# Altium footprint library Components.PcbLib: 139 footprints (part 2 of 9)
Each footprint in its own frame and in the unit in brackets; x right, y up, seen from the top. Pads: shape width x height; smd on the part's side, far side on the other; paste and mask are expansions set on the pad; w line width, h text height; cw(c..) or ccw(c..) is an arc to the next point about the centre after c.
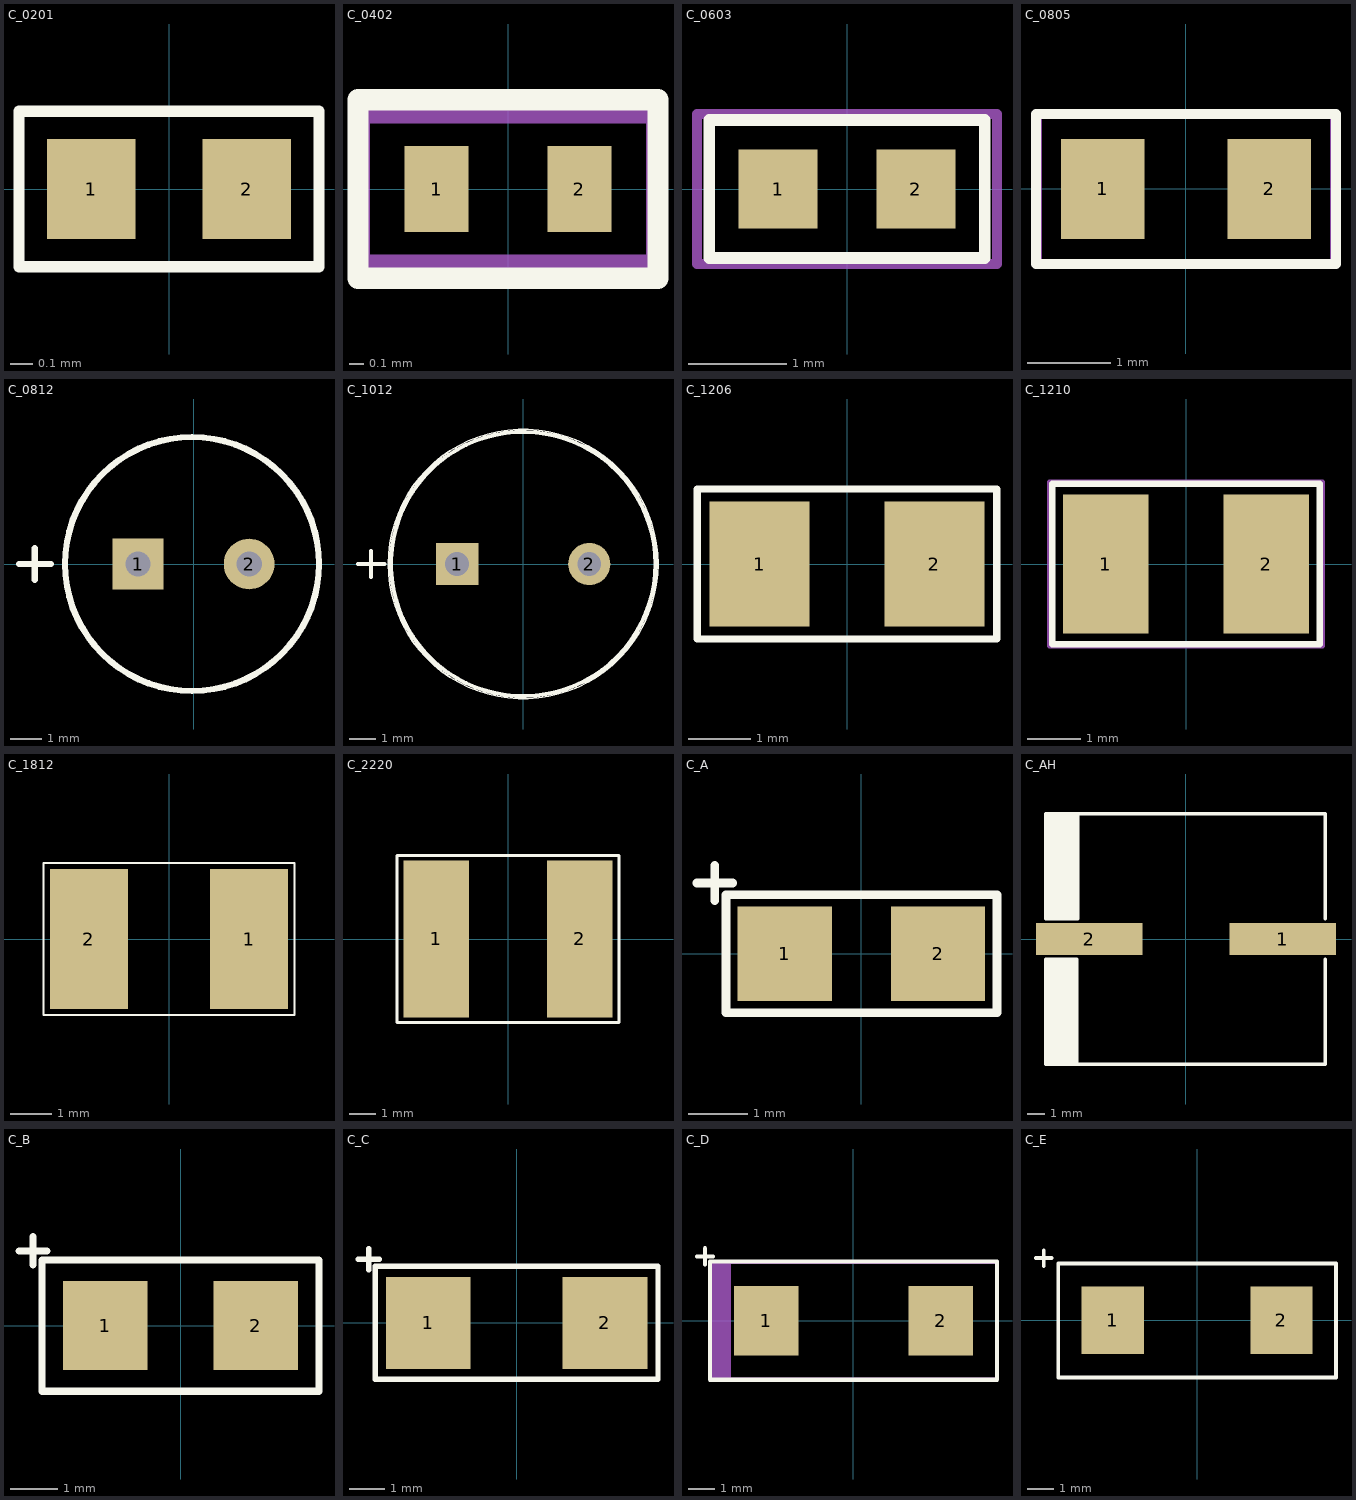
[diagram p1: the footprints below, top view; thin cyan lines are the x and y axes]

## C_0201 [mm]
pads (2):
  rect 0.4x0.45 smd paste-0.03 mask+0.04: 1(-0.35,0) 2(0.35,0)
Top Overlay:
  lines w0.05: -0.675,-0.35 -0.675,0.35 0.675,0.35 0.675,-0.35 -0.675,-0.35
3D body "User Library-SMD CAPACITOR.step": height 0.29, standoff -0.01, extent -0.3,-0.15 0.3,0.15

## C_0402 [mm]
pads (2):
  rect 0.45x0.6 smd paste-0.04 mask+0.05: 1(-0.5,0) 2(0.5,0)
Top Overlay:
  lines w0.15: -1.05,-0.625 -1.05,0.125 -1.05,0.625 1.05,0.625 1.05,-0.625 -1.05,-0.625
Mechanical 29:
  lines w0.1: -1.016,-0.508 1.016,-0.508 1.016,0.508 -1.016,0.508 -1.016,-0.508
  text ".Designator" at -0.889,-0.254 h0.5
3D body "SW3dPS-0402 SMD Capacitor.STEP": height 0.2, standoff 0, extent -0.5,-0.3 0.5,0.3

## C_0603 [mm]
pads (2):
  rect 0.8x0.8 smd paste-0.06 mask+0.08: 1(-0.7,0) 2(0.7,0)
Top Overlay:
  lines w0.12: -1.4,-0.7 -1.4,0 -1.4,0.7 1.4,0.7 1.4,-0.7 -1.4,-0.7
Mechanical 29:
  lines w0.1: -1.524,-0.762 -1.524,0.762 1.524,0.762 1.524,-0.762 -1.524,-0.762
  text ".Designator" at -1.27,-0.254 h0.8
3D body "SW3dPS-0603 SMD Capacitor.STEP": height 0.3, standoff 0, extent -0.8,-0.4 0.8,0.4

## C_0805 [mm]
pads (2):
  rect 1x1.2 smd paste-0.05 mask+0.102: 1(-1,0) 2(1,0)
Top Overlay:
  lines w0.12: -1.8,-0.9 -1.8,0 -1.8,0.9 1.8,0.9 1.8,-0.9 -1.8,-0.9
Mechanical 29:
  lines w0.1: -1.778,-0.889 -1.778,0.889 1.778,0.889 1.778,-0.889 -1.778,-0.889
  text ".Designator" at -1.651,-0.381 h0.8
3D body "SW3dPS-0805 SMD Capacitor.STEP": height 0.78, standoff 0, extent -1,-0.65 1,0.6

## C_0812 [mm]
pads (2):
  rect 1.6x1.6 / inner round 1.6 / far side rect 1.6x1.6 hole 0.8 mask+0.05: 1(-1.75,0)
  round 1.6 hole 0.8 mask+0.05: 2(1.75,0)
Top Overlay:
  circle w0.2: c-0.05,0 r4
  lines w0.2: -5.5,0 -4.5,0 ; -5,-0.5 -5,0.5
3D body "ELECTROLITIC CAPACITOR 8X12.STEP": height 12, standoff -2.5, extent -4,-4 4,4

## C_1012 [mm]
pads (2):
  rect 1.6x1.6 / inner round 1.6 / far side rect 1.6x1.6 hole 0.9 mask+0.05: 1(-2.5,0)
  round 1.6 hole 0.9 mask+0.05: 2(2.5,0)
Top Overlay:
  circle w0.15: c0,0 r5
  circle w0.05: c0,0 r5.1
  lines w0.15: -6.25,0 -5.25,0 ; -5.75,-0.5 -5.75,0.5
3D body "SW3DPS-ELECTROLITIC CAPACITOR RADIAL 10X12-DEFAULT.STEP": height 12, standoff -2.5, extent -5,-5 5,5

## C_1206 [mm]
pads (2):
  rect 1.6x2 smd paste-0.09: 1(-1.4,0) 2(1.4,0)
Top Overlay:
  lines w0.12: -2.4,-1.2 -2.4,0 -2.4,1.2 2.4,1.2 2.4,-1.2 -2.4,-1.2
3D body "SW3dPS-1206 SMD Capacitor.STEP": height 1, standoff 0, extent -1.55,-0.8 1.65,0.8

## C_1210 [mm]
pads (2):
  rect 1.6x2.6 smd paste-0.1: 1(-1.5,0) 2(1.5,0)
Top Overlay:
  lines w0.12: -2.5,-1.5 -2.5,0 -2.5,1.5 2.5,1.5 2.5,-1.5 -2.5,-1.5
Mechanical 29:
  lines w0.1: -2.54,-1.524 2.54,-1.524 2.54,1.524 -2.54,1.524 -2.54,-1.524
  text ".Designator" at -2.159,-0.381 h1
3D body "SW3dPS-CAPC3225.STEP": height 2.5, standoff 0, extent -1.6,-1.25 1.6,1.25

## C_1812 [mm]
pads (2):
  rect 1.9x3.4 smd paste-0.2 mask+0.1: 1(1.95,0) 2(-1.95,0)
Top Overlay:
  lines w0.05: -3.05,-1.85 -3.05,1.85 3.05,1.85 3.05,-1.85 -3.05,-1.85
3D body "C-1812.STEP": height 1.6, standoff 0, extent -2.3,-1.6 2.2,1.6

## C_2220 [mm]
pads (2):
  rect 2.5x6 smd paste-0.1: 1(-2.75,0) 2(2.75,0)
Top Overlay:
  lines w0.12: -4.25,-3.2 4.25,-3.2 4.25,3.2 -4.25,3.2 -4.25,-3.2
3D body "User Library-cap2220.STEP": height 2.3, standoff 0, extent -3.643,-2.7 3.342,2.761

## C_A [mm]
pads (2):
  rect 1.6x1.6 smd paste-0.09: 1(-1.3,0) 2(1.3,0)
Top Overlay:
  lines w0.15: -2.79,1.2 -2.19,1.2 ; -2.49,0.9 -2.49,1.5 ; -2.3,-1 2.3,-1 2.3,1 -2.3,1 -2.3,0 -2.3,-1
3D body "SW3dPS-cap_a.STEP": height 1.61, standoff 0, extent -1.595,-0.8 1.595,0.8

## C_AH [mm]
pads (2):
  rect 6x1.8 smd paste-0.1 mask+0.1: 1(5.45,0) 2(-5.45,0)
Top Overlay:
  lines w0.2: -7.7,-7.05 -7.7,-1.15 ; -7.7,1.15 -7.7,7.05 ; -7.5,-7.05 -7.5,-1.15 ; -7.5,1.15 -7.5,7.05 ; -7.3,-7.05 -7.3,-1.15 ; -7.3,1.15 -7.3,7.05 ; -7.1,-7.05 -7.1,-1.15 ; -7.1,1.15 -7.1,7.05 ; -6.95,-7.05 -6.95,-1.15 ; -6.9,1.15 -6.9,7.05 ; -6.75,-7.05 -6.75,-1.15 ; -6.7,1.15 -6.7,7.05 ; -6.55,-7.05 -6.55,-1.15 ; -6.5,1.15 -6.5,7.05 ; -6.35,-7.05 -6.35,-1.15 ; -6.3,1.15 -6.3,7.05 ; -6.15,-7.05 -6.15,-1.15 -7.9,-1.15 -7.9,-7.05 7.85,-7.05 7.85,-1.15 ; -6.15,1.15 -7.9,1.15 -7.9,7.05 7.85,7.05 7.85,1.15 ; -6.1,1.15 -6.1,7.05
3D body "User Library-CAP_AL_EL_SMT_12x13.STEP": height 12.5, standoff 0, extent -7.85,-6.997 7.85,6.997

## C_B [mm]
pads (2):
  rect 1.8x1.9 smd paste-0.1: 1(-1.6,0) 2(1.6,0)
Top Overlay:
  lines w0.15: -3.44,1.59 -2.84,1.59 ; -3.14,1.29 -3.14,1.89 ; -2.95,-1.4 -2.95,0 -2.95,1.4 2.95,1.4 2.95,-1.4 -2.95,-1.4
3D body "SW3dPS-cap_b.STEP": height 1.91, standoff 0, extent -1.746,-1.4 1.746,1.4

## C_C [mm]
pads (2):
  rect 2.4x2.6 smd paste-0.12: 1(-2.5,0) 2(2.5,0)
Top Overlay:
  lines w0.15: -4.49,1.8 -3.89,1.8 ; -4.19,1.5 -4.19,2.1 ; -4,-1.6 4,-1.6 4,1.6 -4,1.6 -4,0 -4,-1.6
3D body "SW3dPS-cap_c.STEP": height 2.51, standoff 0, extent -2.997,-1.6 2.997,1.6

## C_D [mm]
pads (2):
  rect 2.4x2.6 smd paste-0.12: 1(-3.25,0) 2(3.25,0)
Top Overlay:
  lines w0.15: -5.83,2.4 -5.23,2.4 ; -5.53,2.1 -5.53,2.7 ; -5.35,-2.2 5.35,-2.2 5.35,2.2 -5.35,2.2 -5.35,0 -5.35,-2.2
Mechanical 29:
  rectangle: -5.334,-2.159 -4.572,2.159
  lines w0.1: -5.334,-2.159 -5.334,2.159 5.334,2.159 5.334,-2.159 -5.334,-2.159
  text ".Designator" at -4.191,-0.762 h1.52
3D body "SW3dPS-cap_d.STEP": height 2.81, standoff 0, extent -3.597,-2.15 3.697,2.15

## C_E [mm]
pads (2):
  rect 2.4x2.6 smd paste-0.12: 1(-3.25,0) 2(3.25,0)
Top Overlay:
  lines w0.15: -6.205,2.4 -5.605,2.4 ; -5.905,2.1 -5.905,2.7 ; -5.35,-2.2 5.35,-2.2 5.35,2.2 -5.35,2.2 -5.35,0 -5.35,-2.2
3D body "SW3dPS-cap_e.STEP": height 4.11, standoff 0, extent -3.597,-2.15 3.697,2.15